# Altium integrated library BMS029B.IntLib: 106 symbols (part 2 of 2)
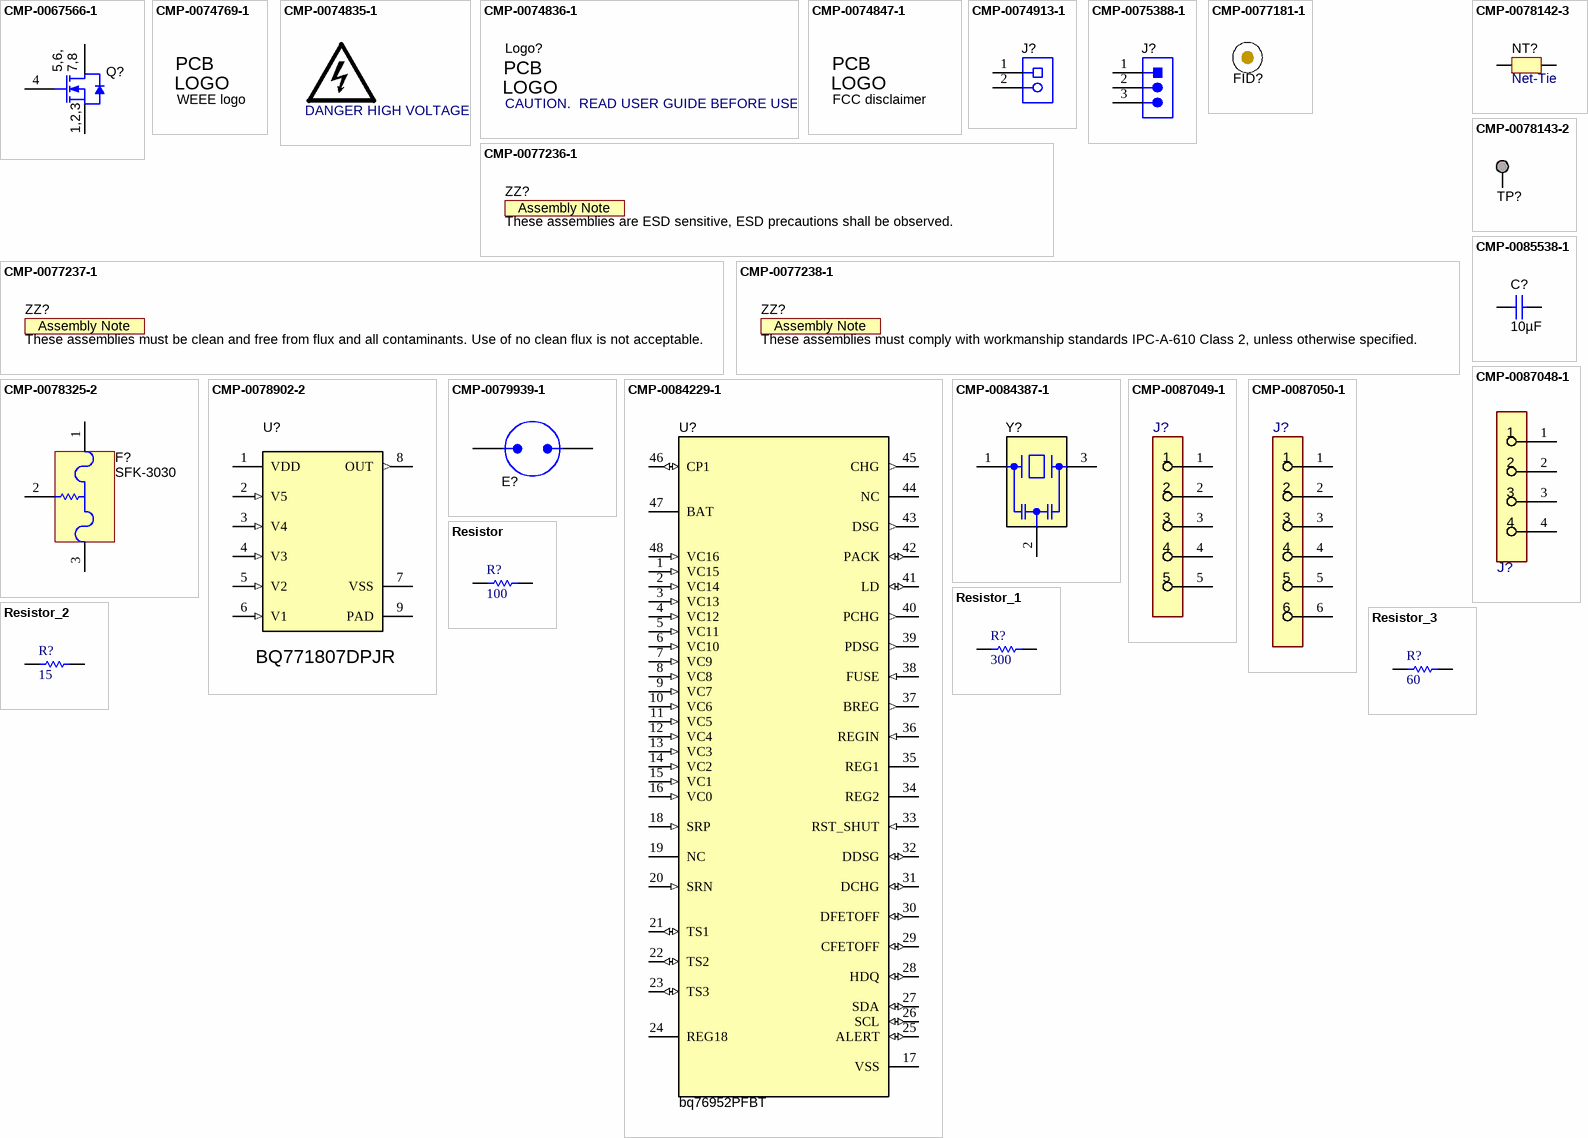
[diagram p3: symbols CMP-0067566-1 to Resistor_3]

## CMP-0084229-1
designator U?, comment bq76952PFBT
Multicell Battery Monitor and Protection Family, PFB0048A (TQFP-48); Alternate PartNumber: bq76952PFBR; Alternate Manufacturer: Texas Instruments; SizeAreaWB_mm2: 121; SizeZ_mm: 1.2; SizeX_mm: 9; SizeArea_mm2: 81; CompType: IC; AEC Qualified: N; AEC Category: Q200; ComponentLink1URL: http://www.ti.com/lit/ds/symlink/bq76952.pdf; PackageDescription: TQFP-48; MountType: SMT; ComponentLink2URL: http://www.ti.com/product/bq76952; ComponentLink3Description: Online Datasheet; ComponentLink2Description: Product Folder; Manufacturer: Texas Instruments; ComponentLink3URL: http://www.ti.com/product/bq76952/datasheet; PackageReference: PFB0048A; SizeY_mm: 9; PartNumber: bq76952PFBT; ComponentLink1Description: Datasheet Link
footprint PFB0048A_N (Thin QFP, 48-Leads, Body 7x7mm, Pitch 0.5mm, IPC Medium Density)
footprint PFB0048A_M (Thin QFP, 48-Leads, Body 7x7mm, Pitch 0.5mm, IPC Low Density)
footprint PFB0048A_L (Thin QFP, 48-Leads, Body 7x7mm, Pitch 0.5mm, IPC High Density)
pins: 1 VC15 (in), 2 VC14 (in), 3 VC13 (in), 4 VC12 (in), 5 VC11 (in), 6 VC10 (in), 7 VC9 (in), 8 VC8 (in), 9 VC7 (in), 10 VC6 (in), 11 VC5 (in), 12 VC4 (in), 13 VC3 (in), 14 VC2 (in), 15 VC1 (in), 16 VC0 (in), 17 VSS (power), 18 SRP (in), 19 NC, 20 SRN (in), 21 TS1 (io), 22 TS2 (io), 23 TS3 (io), 24 REG18 (power), 25 ALERT (io), 26 SCL (io), 27 SDA (io), 28 HDQ (io), 29 CFETOFF (io), 30 DFETOFF (io), 31 DCHG (io), 32 DDSG (io), 33 RST_SHUT (in), 34 REG2 (power), 35 REG1 (power), 36 REGIN (in), 37 BREG (out), 38 FUSE (in), 39 PDSG (out), 40 PCHG (out), 41 LD (io), 42 PACK (io), 43 DSG (out), 44 NC, 45 CHG (out), 46 CP1 (io), 47 BAT (power), 48 VC16 (in)

## CMP-0084387-1
designator Y?, comment CSTCR4M00G55B-R0  (value not drawn)
Resonator, 4 MHz, 39 pF, AEC-Q200 Grade 1, SMD; Manufacturer: MuRata; Frequency_Fixed: 4MHz; SizeAreaWB_mm2: 16.5; SizeArea_mm2: 9; SizeX_mm: 4.5; SizeY_mm: 2; SizeZ_mm: 1.2; TaMin_C: -40°C; TaMax_C: 125°C; AEC Category: Q200; AEC Grade: 1; AEC Qualified: Y; Load Capacitance: 39 pF; PartNumber: CSTCR4M00G55B-R0; CompType: Resonator; PackageReference: 4.5x1.2x2 mm; MountType: SMT; RoHS: Y; ComponentLink1Description: Datasheet Link; ComponentLink1URL: https://www.murata.com/~/media/webrenewal/support/library/catalog/products/timingdevice/ceralock/p16e.ashx
footprint Murata_CSTCR_G (Murata)
pins: 1 In, 2 GND, 3 Out

## CMP-0085538-1
designator C?, comment ValueDisplayed: 10µF  (hidden comment: CL21A106KOQNNNG)
CAP, CERM, 10 µF, 16 V,+/- 10%, X5R, 0805; Manufacturer: Samsung Electro-Mechanics; Polarized: N; CompType: Capacitor; Value: 10uF; U/M: EA; VDC_V: 16V; TaMin_C: -55°C; TaMax_C: 85°C; Cap_Case: 0805; SizeArea_mm2: 2.5; SizeAreaWB_mm2: 6.75; SizeX_mm: 2; SizeY_mm: 1.25; SizeZ_mm: 1.45; AEC Category: Q200; PartNumber: CL21A106KOQNNNG; PackageReference: 0805; RoHS: Y; Cap_F: 10µF; Tolerance_%: 10%; Value2: 16V; MountType: SMT; Technology: Ceramic; TempCo: X5R; ComponentLink1Description: Datasheet link; ComponentLink1URL: http://www.samsungsem.com/kr/support/product-search/mlcc/__icsFiles/afieldfile/2018/06/20/CL21A106KOQNNNG.pdf; AEC Qualified: N; AEC Grade: N/A
footprint 0805_HV (0805 with 30mil clearance between pads)
footprint 0805_HV1 (Custom footprint based on analyzing multiple manufacturer recommendations)
footprint 0805 (0805 from SM-752 data)
footprint 0805M (0805 from SM-752 data)
footprint 0805L (0805 from SM-752 data)
pins: 1, 2

## CMP-0087048-1
designator J?, comment OSTTE040161  (value not drawn)
TERM BLOCK 3.5MM VERT 4POS PCB; Manufacturer: On Shore Technology; Symbol Name: SYM-OSTTE040161; Row_Count: 1; Current_A: 10A; ContactFinish: Tin; Voltage_V: 300V; PinCount: 4; PartNumber: OSTTE040161; PackageReference: HDR4; ComponentLink1URL: http://www.on-shore.com/wp-content/uploads/2019/02/OSTTEXX0161.pdf; ComponentLink1Description: Datasheet; RoHS: TRUE
footprint FP-OSTTE040161_HDR4-MFG
pins: 1, 2, 3, 4

## CMP-0087049-1
designator J?, comment OSTTE050161  (value not drawn)
TERM BLOCK 3.5MM VERT 5POS PCB; Manufacturer: On Shore Technology; Symbol Name: SYM-OSTTE050161; Row_Count: 1; ContactFinish: Tin; Current_A: 10A; Voltage_V: 300V; ComponentLink1Description: Datasheet; PinCount: 5; PartNumber: OSTTE050161; RoHS: TRUE; PackageReference: HDR5; ComponentLink1URL: http://www.on-shore.com/wp-content/uploads/2019/02/OSTTEXX0161.pdf
footprint FP-OSTTE050161_HDR5-MFG
pins: 1, 2, 3, 4, 5

## CMP-0087050-1
designator J?, comment OSTTE060161  (value not drawn)
TERM BLOCK 3.5MM VERT 6POS PCB; Manufacturer: On Shore Technology; ContactFinish: Tin; Current_A: 10A; Voltage_V: 300V; Row_Count: 1; Symbol Name: SYM-OSTTE060161; PinCount: 6; RoHS: TRUE; ComponentLink1URL: http://www.on-shore.com/wp-content/uploads/2019/02/OSTTEXX0161.pdf; ComponentLink1Description: Datasheet; PartNumber: OSTTE060161; PackageReference: HDR6
footprint FP-OSTTE060161_HDR6-MFG
pins: 1, 2, 3, 4, 5, 6

## Resistor
designator R?, comment 100
0603,0.1W; Published: 8-Jun-2000; LatestRevisionDate: 17-Jul-2002; LatestRevisionNote: Re-released for DXP Platform.; PackageReference: AXIAL-0.5; Publisher: Altium Limited; Value: 100
footprint RESC0603
pins: 1, 2

## Resistor_1
designator R?, comment 300
0603,0.1W; Published: 8-Jun-2000; LatestRevisionDate: 17-Jul-2002; LatestRevisionNote: Re-released for DXP Platform.; PackageReference: AXIAL-0.5; Publisher: Altium Limited; Value: 300
footprint RESC0603
pins: 1, 2

## Resistor_2
designator R?, comment 15
0603,0.1W; Published: 8-Jun-2000; LatestRevisionDate: 17-Jul-2002; LatestRevisionNote: Re-released for DXP Platform.; PackageReference: AXIAL-0.5; Publisher: Altium Limited; Value: 15
footprint RESC0603
footprint RES2512
pins: 1, 2

## Resistor_3
designator R?, comment 60
0603,0.1W; Published: 8-Jun-2000; LatestRevisionDate: 17-Jul-2002; LatestRevisionNote: Re-released for DXP Platform.; PackageReference: AXIAL-0.5; Publisher: Altium Limited; Value: 60
footprint RESC0603
pins: 1, 2